# Altium footprint library PART.PcbLib: 407 footprints (part 2 of 26)
Each footprint in its own frame and in the unit in brackets; x right, y up, seen from the top. Pads: shape width x height; smd on the part's side, far side on the other; paste and mask are expansions set on the pad; w line width, h text height; cw(c..) or ccw(c..) is an arc to the next point about the centre after c.
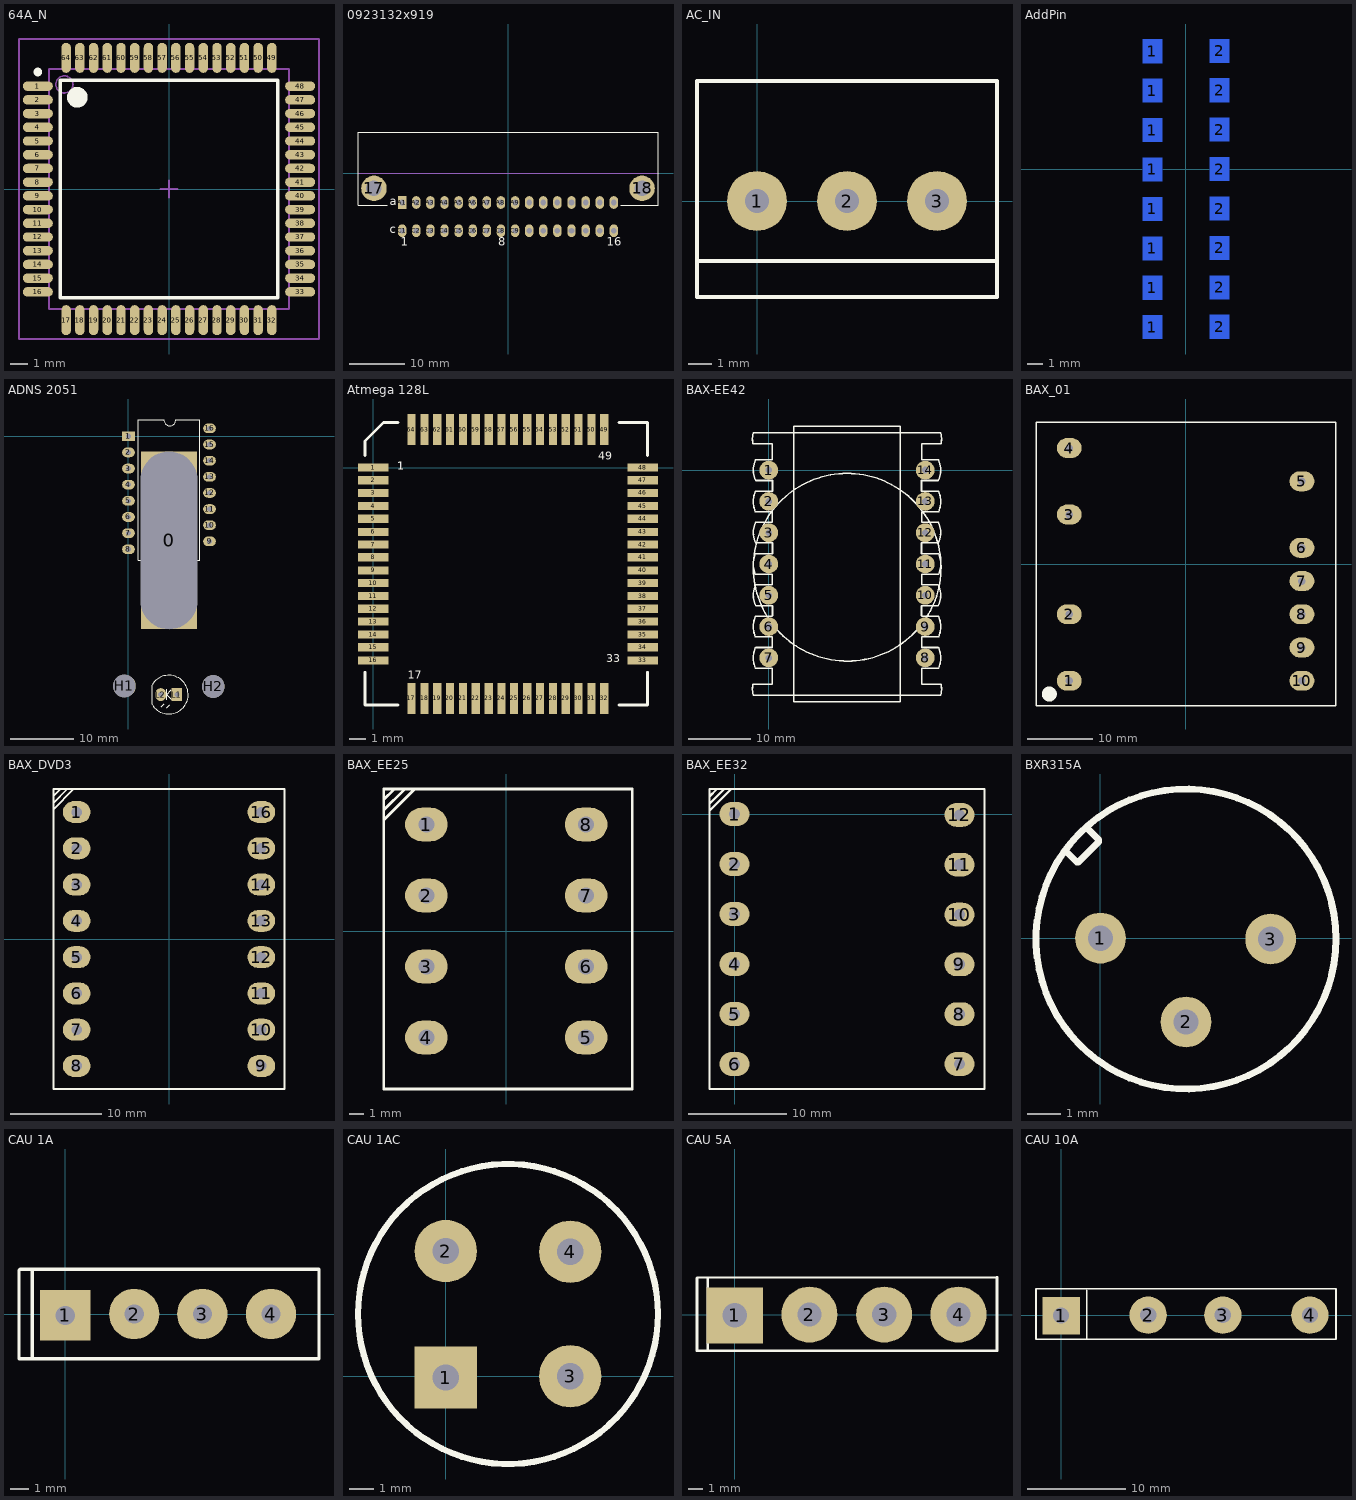
[diagram p1: the footprints below, top view; thin cyan lines are the x and y axes]

## 64A_N [mm] "Thin QFP, 64-Leads, Body 14x14mm, Pitch 0.8mm, IPC Medium Density"
height 1.2
pads (64):
  oval 1.75x0.55 smd: 1(-7.65,6) 2(-7.65,5.2) 3(-7.65,4.4) 4(-7.65,3.6) 5(-7.65,2.8) 6(-7.65,2) 7(-7.65,1.2) 8(-7.65,0.4) 9(-7.65,-0.4) 10(-7.65,-1.2) 11(-7.65,-2) 12(-7.65,-2.8) 13(-7.65,-3.6) 14(-7.65,-4.4) 15(-7.65,-5.2) 16(-7.65,-6) 33(7.65,-6) 34(7.65,-5.2) 35(7.65,-4.4) 36(7.65,-3.6) 37(7.65,-2.8) 38(7.65,-2) 39(7.65,-1.2) 40(7.65,-0.4) 41(7.65,0.4) 42(7.65,1.2) 43(7.65,2) 44(7.65,2.8) 45(7.65,3.6) 46(7.65,4.4) 47(7.65,5.2) 48(7.65,6)
  oval 0.55x1.75 smd: 17(-6,-7.65) 18(-5.2,-7.65) 19(-4.4,-7.65) 20(-3.6,-7.65) 21(-2.8,-7.65) 22(-2,-7.65) 23(-1.2,-7.65) 24(-0.4,-7.65) 25(0.4,-7.65) 26(1.2,-7.65) 27(2,-7.65) 28(2.8,-7.65) 29(3.6,-7.65) 30(4.4,-7.65) 31(5.2,-7.65) 32(6,-7.65) 49(6,7.65) 50(5.2,7.65) 51(4.4,7.65) 52(3.6,7.65) 53(2.8,7.65) 54(2,7.65) 55(1.2,7.65) 56(0.4,7.65) 57(-0.4,7.65) 58(-1.2,7.65) 59(-2,7.65) 60(-2.8,7.65) 61(-3.6,7.65) 62(-4.4,7.65) 63(-5.2,7.65) 64(-6,7.65)
Top Overlay:
  circle w0.25: c-7.65,6.825 r0.125
  circle w0.6: c-5.35,5.35 r0.3
  lines w0.2: -6.35,-6.35 -6.35,6.35 6.35,6.35 6.35,-6.35 -6.35,-6.35
Mechanical 13:
  circle w0.1: c-6.1,6.1 r0.5
  lines w0.1: -7,-7 -7,7 7,7 7,-7 -7,-7
Mechanical 15:
  lines w0.1: -0.5,0 0.5,0 ; 0,-0.5 0,0.5 ; -8.75,-8.75 -8.75,8.75 8.75,8.75 8.75,-8.75 -8.75,-8.75
3D body: height 1.2, standoff 0, extent -7,-7 7,7

## 0923132x919 [mm] "Connector; DIN 41612, Type 2C, Thru-Hole; Rows a+c, 32 Position; Right Angle"
height 11.1
pads (34):
  round 4.6 hole 2.8: 17(-24.13,-2.76) 18(24.13,-2.76)
  rect 1.524x2.286 hole 1: A1(-19.05,-5.3)
  oval 1.524x2.286 hole 1: A2(-16.51,-5.3) A3(-13.97,-5.3) A4(-11.43,-5.3) A5(-8.89,-5.3) A6(-6.35,-5.3) A7(-3.81,-5.3) A8(-1.27,-5.3) A9(1.27,-5.3) A10(3.81,-5.3) A11(6.35,-5.3) A12(8.89,-5.3) A13(11.43,-5.3) A14(13.97,-5.3) A15(16.51,-5.3) A16(19.05,-5.3) C1(-19.05,-10.38) C2(-16.51,-10.38) C3(-13.97,-10.38) C4(-11.43,-10.38) C5(-8.89,-10.38) C6(-6.35,-10.38) C7(-3.81,-10.38) C8(-1.27,-10.38) C9(1.27,-10.38) C10(3.81,-10.38) C11(6.35,-10.38) C12(8.89,-10.38) C13(11.43,-10.38) C14(13.97,-10.38) C15(16.51,-10.38) C16(19.05,-10.38)
Top Overlay:
  lines w0.2: -21.75,-5.8 -27,-5.8 -27,7.34 27,7.34 27,-5.8 20.275,-5.8
  text "1" at -19.3,-13.08 h1.5
  text "a" at -21.26,-5.8 h1.5
  text "c" at -21.26,-10.88 h1.5
  text "8" at -1.77,-13.08 h1.5
  text "16" at 17.8,-13.08 h1.5
Mechanical 1:
  lines w0.1: -27,0 27,0
  text "PCB Edge" at -26.15,0.5 h0.6

## AC_IN [mil] "AC_Input"
height 3
pads (3):
  round 100 hole 40 square: 1(0,0) 2(150,0) 3(300,0)
Top Overlay:
  lines w7: -100,-100 400,-100 ; -100,-160 400,-160 400,200 -100,200 -100,-160

## AddPin [mil] "Add"
pads (16):
  rect 50x60 smd far side: 1(-84,-400) 1(-84,-300) 1(-84,-200) 1(-84,-100) 1(-84,0) 1(-84,100) 1(-84,200) 1(-84,300) 2(86,-399) 2(86,-299) 2(86,-199) 2(86,-99) 2(86,1) 2(86,101) 2(86,201) 2(86,301)

## ADNS 2051 [mil] "Foots pin for Mouse"
pads (21):
  rect 350x1100 hole 350 slot 1100 at 90 deg: 0(251,-645)
  rect 78.74x60 hole 31.5: 1(0,0)
  oval 78.74x60 hole 31.5: 2(0,-100) 3(0,-200) 4(0,-300) 5(0,-400) 6(0,-500) 7(0,-600) 8(0,-700) 9(502,-651) 10(502,-551) 11(502,-451) 12(502,-351) 13(502,-251) 14(502,-151) 15(502,-51) 16(502,49)
  round 140 hole 140: H1(-25,-1547) H2(525,-1550)
  rect 65x80 hole 32: L1(300,-1600.5)
  oval 65x80 hole 32: L2(200,-1600.5)
Top Overlay:
  lines w7: 146,-1660.5 146,-1541.5 ; 146.06,-1540.53 cw(c250,-1600.5) 146.49,-1661.21 ; 204,-1675.5 221,-1658.5 ; 218,103 59,103 59,-767 443,-767 443,103 296,103 ; 218.97,101 ccw(c255.99,101) 293,101 ; 236,-1632.5 236,-1566.5 ; 238,-1681.5 255,-1664.5 ; 265,-1629.5 236,-1600.5 265,-1571.5 ; 394.94,-516.95 ccw(c252.8,-525.96) 395,-518
  text "ADNS2051" at 108,-229 h40

## Atmega 128L [mil] "Atmega 128L, 64 pin SMT"
height 100
pads (64):
  rect 75x20 smd: 1(0,0) 2(0,-31) 3(0,-62) 4(0,-94) 5(0,-125) 6(0,-157) 7(0,-188) 8(0,-219) 9(0,-251) 10(0,-282) 11(0,-314) 12(0,-345) 13(0,-376) 14(0,-408) 15(0,-439) 16(0,-471) 33(658,-471) 34(658,-439) 35(658,-408) 36(658,-376) 37(658,-345) 38(658,-314) 39(658,-282) 40(658,-251) 41(658,-219) 42(658,-188) 43(658,-157) 44(658,-125) 45(658,-94) 46(658,-62) 47(658,-31) 48(658,0)
  rect 20x75 smd: 17(93,-564) 18(125,-564) 19(156,-564) 20(187,-564) 21(219,-564) 22(250,-564) 23(282,-564) 24(313,-564) 25(344,-564) 26(376,-564) 27(407,-564) 28(439,-564) 29(470,-564) 30(501,-564) 31(533,-564) 32(564,-564) 49(564,93) 50(533,93) 51(501,93) 52(470,93) 53(439,93) 54(407,93) 55(376,93) 56(344,93) 57(313,93) 58(282,93) 59(250,93) 60(219,93) 61(187,93) 62(156,93) 63(125,93) 64(93,93)
Top Overlay:
  lines w7: -20,-500 -20,-580 60,-580 ; -20,30 -20,65 25,110 60,110 ; 600,-580 670,-580 670,-500 ; 600,110 670,110 670,30
  text "1" at 59,-5.5 h20
  text "1" at 59,-5.5 h20
  text "49" at 549,19.5 h20
  text "17" at 84,-515.5 h20
  text "33" at 569,-475.5 h20

## BAX-EE42 [mm]
pads (14):
  round 3 hole 1.1: 1(0,0) 2(0,-5) 3(0,-10) 4(0,-15) 5(0,-20) 6(0,-25) 7(0,-30) 8(25,-30) 9(25,-25) 10(25,-20) 11(25,-15) 12(25,-10) 13(25,-5) 14(25,0)
Top Overlay:
  lines w0.254: -2.54,-34.199 ccw(c1.383,-34.971) -2.495,-35.943 ; -2.54,4.201 cw(c1.383,4.974) -2.495,5.945 ; -2.515,-34.188 0.559,-34.188 0.559,-31.648 -2.083,-31.648 ; -2.515,4.191 0.559,4.191 0.559,1.651 -2.083,1.651 ; -2.5,-36 27.5,-36 ; -2.5,6 27.5,6 ; -2.464,-14.986 ccw(c12.522,-15.519) -2.458,-14.838 ; -2.147,-28.374 ccw(c1.506,-30.001) -2.136,-31.652 ; -2.147,-23.371 ccw(c1.506,-24.997) -2.136,-26.648 ; -2.147,-13.363 ccw(c1.506,-14.989) -2.136,-16.64 ; -2.147,-3.381 ccw(c1.506,-5.007) -2.136,-6.658 ; -2.121,-18.367 ccw(c1.531,-19.993) -2.11,-21.644 ; -2.121,-8.359 ccw(c1.531,-9.985) -2.11,-11.636 ; -2.121,1.623 ccw(c1.531,-0.003) -2.11,-1.654 ; -2.108,-28.346 0.533,-28.346 ; -2.108,-23.343 0.533,-23.343 ; -2.108,-13.335 0.533,-13.335 ; -2.108,-3.353 0.533,-3.353 ; -2.083,-26.645 0.559,-26.645 ; -2.083,-18.339 0.559,-18.339 ; -2.083,-16.637 0.559,-16.637 0.559,-18.288 ; -2.083,-8.331 0.559,-8.331 ; -2.083,-6.655 0.559,-6.655 0.559,-8.306 ; -2.057,-21.641 0.584,-21.641 0.584,-23.292 ; -2.057,-11.633 0.584,-11.633 ; -2.057,-1.651 0.584,-1.651 ; 0.559,-28.321 0.559,-26.67 ; 0.584,-13.335 0.584,-11.684 ; 0.584,-3.353 0.584,-1.702 ; 4.013,-37.008 4.013,7.01 20.98,7.01 20.98,-37.008 4.039,-37.008 ; 24.409,-23.292 24.409,-21.641 27.051,-21.641 ; 24.409,-13.335 24.409,-11.684 ; 24.409,-11.633 27.051,-11.633 ; 24.409,-3.353 24.409,-1.702 ; 24.409,-1.651 27.051,-1.651 ; 24.435,-28.321 24.435,-26.67 ; 24.435,-26.645 27.076,-26.645 ; 24.435,-18.339 27.076,-18.339 ; 24.435,-18.288 24.435,-16.637 27.076,-16.637 ; 24.435,-8.331 27.076,-8.331 ; 24.435,-8.306 24.435,-6.655 27.076,-6.655 ; 24.46,-28.346 27.102,-28.346 ; 24.46,-23.343 27.102,-23.343 ; 24.46,-13.335 27.102,-13.335 ; 24.46,-3.353 27.102,-3.353 ; 27.076,-31.648 24.435,-31.648 24.435,-34.188 27.508,-34.188 ; 27.076,1.651 24.435,1.651 24.435,4.191 27.508,4.191 ; 27.104,-21.644 ccw(c23.462,-19.993) 27.115,-18.367 ; 27.104,-11.636 ccw(c23.462,-9.985) 27.115,-8.359 ; 27.104,-1.654 ccw(c23.462,-0.003) 27.115,1.623 ; 27.129,-31.652 ccw(c23.488,-30.001) 27.14,-28.374 ; 27.129,-26.648 ccw(c23.488,-24.997) 27.14,-23.371 ; 27.129,-16.64 ccw(c23.488,-14.989) 27.14,-13.363 ; 27.129,-6.658 ccw(c23.488,-5.007) 27.14,-3.381 ; 27.489,-35.943 ccw(c23.61,-34.971) 27.533,-34.199 ; 27.489,5.945 cw(c23.61,4.974) 27.533,4.201

## BAX_01 [mil] "Bien ap xung cho nguon T9AT"
pads (10):
  oval 150x120 hole 45: 1(-700,-700) 2(-700,-300) 3(-700,300) 4(-700,700) 5(700,500) 6(700,100) 7(700,-100) 8(700,-300) 9(700,-500) 10(700,-700)
Top Overlay:
  circle w50: c-820,-780 r20
  lines w8: -900,-850 905,-850 905,855 -900,855 -900,-850

## BAX_DVD3 [mil] "Bien ap xung DVD3"
pads (16):
  oval 120x95 hole 45: 1(-400,550) 2(-400,392.86) 3(-400,235.71) 4(-400,78.57) 5(-400,-78.57) 6(-400,-235.71) 7(-400,-392.86) 8(-400,-550) 9(400,-550) 10(400,-392.86) 11(400,-235.71) 12(400,-78.57) 13(400,78.57) 14(400,235.71) 15(400,392.86) 16(400,550)
Top Overlay:
  lines w8: -500,563 -414,649 ; -500,589 -500,591 -442,649 ; -500,618 -500,620 -471,649 ; -500,-650 -500,650 490,650 500,650 500,-650 -500,-650

## BAX_EE25 [mil] "EE25"
pads (8):
  oval 120x95 hole 45: 1(-225,300) 2(-225,100) 3(-225,-100) 4(-225,-300) 5(225,-300) 6(225,-100) 7(225,100) 8(225,300)
Top Overlay:
  lines w8: -345,313 -259,399 ; -345,339 -345,341 -287,399 ; -345,368 -345,370 -316,399 ; -345,-445 355,-445 355,400 -345,400 -345,-445

## BAX_EE32 [mil] "EE32"
pads (12):
  oval 120x95 hole 45: 1(0,0) 2(0,-200) 3(0,-400) 4(0,-600) 5(0,-800) 6(0,-1000) 7(900,-1000) 8(900,-800.71) 9(900,-601.43) 10(900,-402.14) 11(900,-202.86) 12(900,-3.57)
Top Overlay:
  lines w8: -100,13 -14,99 ; -100,39 -100,41 -42,99 ; -100,68 -100,70 -71,99 ; -100,-1100 -100,100 1000,100 1000,-1100 -100,-1100

## BXR315A [mil] "Xtal for RF"
pads (3):
  round 60 hole 30: 1(0,0) 2(101,-99) 3(201,-1)
Top Overlay:
  circle w8: c101,-1 r177.17
  lines w8: -41,103 -28,90 -26,90 -2,114 -2,116 -15,129
3D body: height 140, standoff -1500, extent -81,-186 279,174

## CAU 1A [mil] "CAU 1A DET"
height 800
pads (4):
  rect 110x110 hole 42: 1(0,-2)
  round 110 hole 42: 2(151,1) 3(300,1) 4(450,1)
Top Overlay:
  lines w7: -72,-95 -72,99 ; -101,-97 -101,97 -99,99 555,99 555,-97 -101,-97
3D body: height 502.76, standoff -450, extent -61.99,-87.24 511.99,110

## CAU 1AC [mil] "CAU 1A TRON"
height 800
pads (4):
  rect 100x100 hole 42: 1(0,-2)
  round 100 hole 42: 2(0,201) 3(200,0) 4(200,200)
Top Overlay:
  circle w10: c100,100 r240.88
3D body: height 260, standoff 60, extent -136,-139 342.11,340.05
3D body: height 140, standoff -60, extent -17.93,-20.93 17.93,15
3D body: height 140, standoff -60, extent 182.07,-18.93 217.93,17
3D body: height 140, standoff -60, extent 182.07,181.07 217.93,217
3D body: height 140, standoff -60, extent -17.93,182.07 17.93,218
3D body: height 270, standoff 250, extent -29.97,168.24 25.86,241.07
3D body: height 270, standoff 250, extent 171.52,-36.7 227.34,36.13
3D body: height 270, standoff 250, extent -40.31,-44.97 39.6,34.23
3D body: height 270, standoff 250, extent 152.98,152.98 231.47,231.47

## CAU 5A [mil] "CAU 5A DET"
height 800
pads (4):
  rect 150x150 hole 65: 1(0,-2)
  round 150 hole 65: 2(200,0) 3(400,0) 4(599,0)
Top Overlay:
  lines w7: -72,-95 -72,99 ; -101,-97 702,-97 702,100 -99,99 -101,97 -101,-97
3D body: height 940.16, standoff -502.14, extent -133.98,-85 743.98,63.03

## CAU 10A [mil] "CAU 10A det"
height 800
pads (4):
  rect 150x150 hole 65: 1(0,-2)
  round 150 hole 65: 2(350,0) 3(650,0) 4(1000,0)
Top Overlay:
  lines w7: 103,-95 103,99 ; -101,-97 -101,104.86 1105,106.36 1105,-97 -101,-97